# Altium footprint library PCB_LIB.PcbLib: 116 footprints (part 6 of 8)
Each footprint in its own frame and in the unit in brackets; x right, y up, seen from the top. Pads: shape width x height; smd on the part's side, far side on the other; paste and mask are expansions set on the pad; w line width, h text height; cw(c..) or ccw(c..) is an arc to the next point about the centre after c.
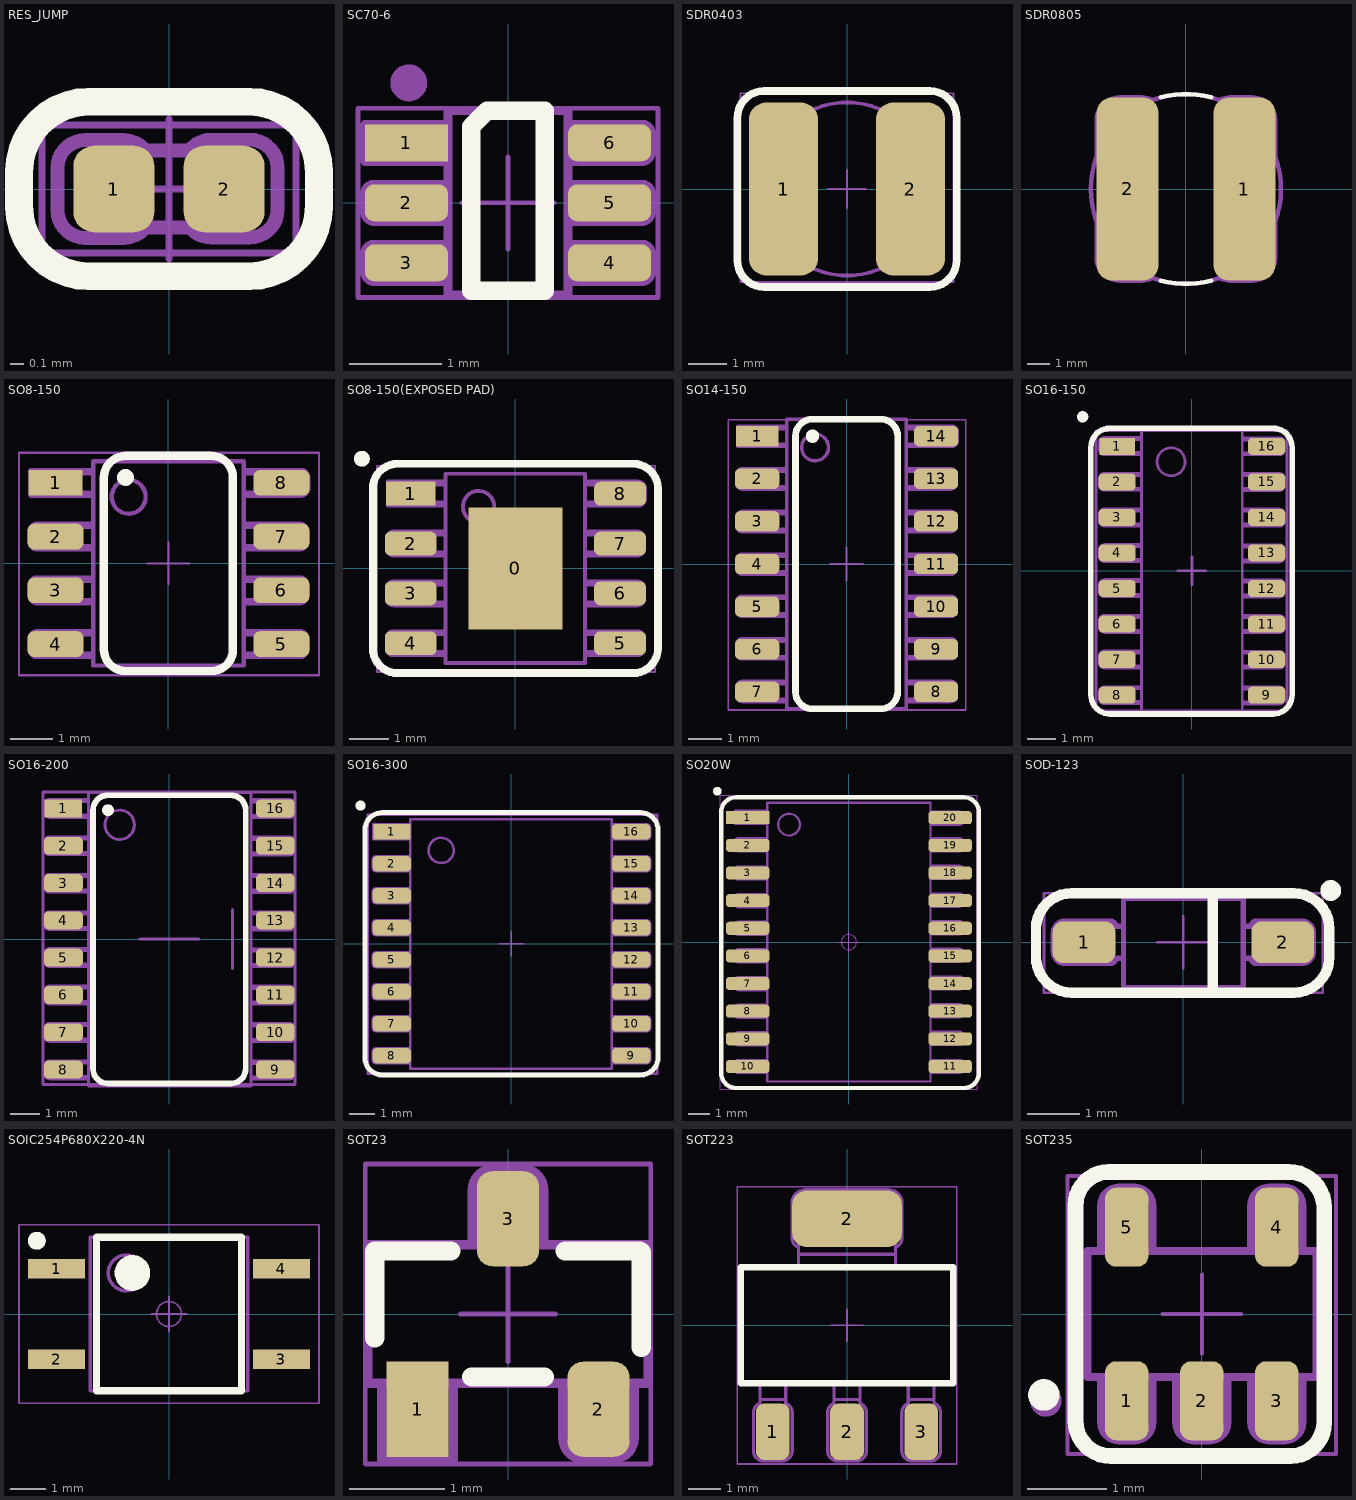
[diagram p5: the footprints below, top view; thin cyan lines are the x and y axes]

## RES_JUMP [mm] "Chip Resistor, EIA 0402, Metric 1005, Body 1.0x0.5mm, IPC Medium Density"
height 0.4
pads (2):
  rrect50% 0.58x0.62 smd: 1(-0.395,0) 2(0.395,0)
Top Overlay:
  lines w0.2: -1.075,-0.125 ccw(c-0.575,-0.125) -0.575,-0.625 0.575,-0.625 ccw(c0.575,-0.125) 1.075,-0.125 1.075,0.125 ccw(c0.575,0.125) 0.575,0.625 -0.575,0.625 ccw(c-0.575,0.125) -1.075,0.125 -1.075,-0.125
Mechanical 14:
  lines w0.1: -0.171,-0.278 cw(c-0.325,-0.15) -0.325,-0.35 -0.6,-0.35 cw(c-0.6,-0.15) -0.8,-0.15 ; -0.171,0.278 ccw(c-0.325,0.15) -0.325,0.35 -0.6,0.35 ccw(c-0.6,0.15) -0.8,0.15 -0.8,-0.15 ; 0.15,-0.275 ccw(c0.304,-0.147) 0.304,-0.347 0.579,-0.347 ccw(c0.579,-0.147) 0.779,-0.147 0.779,0.153 ccw(c0.579,0.153) 0.579,0.353 0.304,0.353 ccw(c0.304,0.153) 0.15,0.281 ; -0.8,-0.15 -0.8,-0.15 ; -0.525,-0.275 0.525,-0.275 0.525,0.275 -0.525,0.275 -0.525,-0.275
  text ".Designator" at -0.8,-0.15 h0.4
  text ".Comment" at -0.508,-0.635 h0.3
Mechanical 15:
  lines w0.05: -0.5,0 0.5,0 ; 0,-0.5 0,0.5 ; -0.91,-0.46 -0.91,0.46 0.91,0.46 0.91,-0.46 -0.91,-0.46
3D body "RESC1005X40N.stp": height 0.4, standoff 0, extent -0.525,-0.275 0.525,0.275

## SC70-6 [mm] "SC70, 6-Leads, Body 2.03x2.10mm, Pitch 0.65mm, IPC Medium Density"
height 1.1
pads (6):
  rect 0.9x0.4 smd: 1(-1.1,0.65)
  rrect50% 0.9x0.4 smd: 2(-1.1,0) 3(-1.1,-0.65) 4(1.1,-0.65) 5(1.1,0) 6(1.1,0.65)
Top Overlay:
  lines w0.2: -0.4,-0.95 -0.4,0.825 -0.225,1 0.4,1 0.4,-0.95 -0.4,-0.95
Mechanical 14:
  circle w0.2: c-1.075,1.3 r0.1
  lines w0.1: -1.55,0.55 -1.55,0.75 ; -1.2,-0.75 -0.65,-0.75 ; -1.2,-0.725 -1.2,-0.575 ; -1.2,-0.55 -0.65,-0.55 ; -1.2,-0.1 -0.65,-0.1 ; -1.2,-0.075 -1.2,0.075 ; -1.2,0.1 -0.65,0.1 ; -1.2,0.55 -0.65,0.55 ; -1.2,0.575 -1.2,0.725 ; -1.2,0.75 -0.65,0.75 ; -0.65,-0.85 -1.45,-0.85 cw(c-1.45,-0.75) -1.55,-0.75 -1.55,-0.55 cw(c-1.45,-0.55) -1.45,-0.45 -0.65,-0.45 ; -0.65,-0.2 -1.45,-0.2 cw(c-1.45,-0.1) -1.55,-0.1 -1.55,0.1 cw(c-1.45,0.1) -1.45,0.2 -0.65,0.2 ; -0.65,0.45 -1.45,0.45 -1.55,0.45 -1.55,0.75 ; -0.65,0.85 -1.45,0.85 -1.55,0.85 -1.55,0.75 ; 0.65,-0.85 1.45,-0.85 ccw(c1.45,-0.75) 1.55,-0.75 1.55,-0.55 ccw(c1.45,-0.55) 1.45,-0.45 0.65,-0.45 ; 0.65,-0.75 1.2,-0.75 ; 0.65,-0.55 1.2,-0.55 ; 0.65,-0.2 1.45,-0.2 ccw(c1.45,-0.1) 1.55,-0.1 1.55,0.1 ccw(c1.45,0.1) 1.45,0.2 0.65,0.2 ; 0.65,-0.1 1.2,-0.1 ; 0.65,0.1 1.2,0.1 ; 0.65,0.45 1.45,0.45 ccw(c1.45,0.55) 1.55,0.55 1.55,0.75 ccw(c1.45,0.75) 1.45,0.85 0.65,0.85 ; 0.65,0.55 1.2,0.55 ; 0.65,0.75 1.2,0.75 ; 1.2,-0.725 1.2,-0.575 ; 1.2,-0.075 1.2,0.075 ; 1.2,0.575 1.2,0.725 ; -0.65,-1 0.65,-1 0.65,1 -0.65,1 -0.65,-1
  text ".Comment" at 0.475,-1 h0.6
  text ".Designator" at 0.025,-1.25 h0.6
Mechanical 15:
  lines w0.05: -0.5,0 0.5,0 ; 0,-0.5 0,0.5 ; -1.625,-1.025 -1.625,1.025 1.625,1.025 1.625,-1.025 -1.625,-1.025
3D body "SC-70-6.STEP": height 1.1, standoff 0, extent -1.06,-1 1.061,1

## SDR0403 [mm] "INDUCTANCE"
pads (2):
  rrect50% 1.8x4.5 smd: 1(-1.65,0) 2(1.65,0)
Top Overlay:
  lines w0.2: -2.85,-1.85 ccw(c-2.15,-1.85) -2.15,-2.55 2.15,-2.55 ccw(c2.15,-1.85) 2.85,-1.85 2.85,1.85 ccw(c2.15,1.85) 2.15,2.55 -2.15,2.55 ccw(c-2.15,1.85) -2.85,1.85 -2.85,-1.85
Mechanical 14:
  circle w0.1: c0,0 r2.25
  lines w0.1: -2.203,-0.4 -1.929,-0.4 ccw(c-1.929,0) -1.929,0.4 -2.203,0.4 ; 2.21,-0.394 1.935,-0.394 cw(c1.935,0.006) 1.935,0.406 2.21,0.406
  text ".Comment" at -2.464,-3.658 h1.5
  text ".Designator" at -4.525,-0.901 h1.9
Mechanical 15:
  lines w0.05: -0.5,0 0.5,0 ; 0,-0.5 0,0.5 ; -2.769,-2.413 -2.769,2.489 2.769,2.489 2.769,-2.413 0,-2.413 -2.769,-2.413
3D body "sdr0403.stp": height 3.2, standoff 0, extent -2.25,-2.25 2.25,2.25

## SDR0805 [mm]
height 10
pads (2):
  rrect50% 2.7x8 smd: 1(2.555,0) 2(-2.55,0)
Top Overlay:
  lines w0.2: -1.1,-4.001 ccw(c0,0) 1.1,-4.001 ; -1.1,4.001 cw(c0,0) 1.1,4.001
Mechanical 14:
  circle w0.2: c0,0 r4.15
  lines w0.2: -3.9,-1.5 -3.9,-3 ccw(c-2.9,-3) -2.9,-4 -1.9,-4 ccw(c-1.9,-3.2) -1.5,-3.893 ; -3.9,1.5 -3.9,3 cw(c-2.9,3) -2.9,4 -1.9,4 cw(c-1.9,3.2) -1.5,3.893 ; 1.5,-3.893 ccw(c1.9,-3.2) 1.9,-4 2.9,-4 ccw(c2.9,-3) 3.9,-3 3.9,-1.5 ; 1.5,3.893 cw(c1.9,3.2) 1.9,4 2.9,4 cw(c2.9,3) 3.9,3 3.9,1.5
  text ".Designator" at -5.105,-0.932 h2.5
3D body "User Library-inductor SDR0805.step": height 5.3, standoff 0, extent -3.925,-3.925 3.875,3.875

## SO8-150 [mil]
pads (8):
  rect 50x24 smd mask+4: 1(-105,75)
  rrect50% 52x24 smd mask+4: 2(-105,25) 3(-105,-25) 4(-105,-75) 5(105,-75) 6(105,-25) 7(105,25) 8(105,75)
Top Overlay:
  circle w7.87: c-40,80 r3.94
  lines w7.87: -60,-80 ccw(c-40,-80) -40,-100 40,-100 ccw(c40,-80) 60,-80 60,80 ccw(c40,80) 40,100 -40,100 ccw(c-40,80) -60,80 -60,-80
Mechanical 14:
  circle w3.94: c-37,62 r15.75
  lines w3.94: -129,-80 ccw(c-122,-80) -122,-87 -73,-87 ccw(c-73,-84) -70,-84 -110,-84 -110,-66 -70,-66 ccw(c-73,-66) -73,-63 -115,-63 -122,-63 ccw(c-122,-70) -129,-70 -129,-80 ; -129,-30 ccw(c-122,-30) -122,-37 -73,-37 ccw(c-73,-34) -70,-34 -110,-34 -110,-16 -70,-16 ccw(c-73,-16) -73,-13 -115,-13 -122,-13 ccw(c-122,-20) -129,-20 -129,-30 ; -129,20 ccw(c-122,20) -122,13 -73,13 ccw(c-73,16) -70,16 -110,16 -110,34 -70,34 ccw(c-73,34) -73,37 -115,37 -122,37 ccw(c-122,30) -129,30 -129,20 ; -128,63 -122,63 -73,63 ccw(c-73,66) -70,66 -110,66 -110,84 -70,84 ccw(c-73,84) -73,87 -115,87 -122,87 -128,87 -128,63 ; -70,-95 -70,95 70,95 70,-95 -70,-95 ; 70,-84 ccw(c73,-84) 73,-87 115,-87 122,-87 ccw(c122,-80) 129,-80 129,-70 ccw(c122,-70) 122,-63 73,-63 ccw(c73,-66) 70,-66 110,-66 110,-84 70,-84 ; 70,-34 ccw(c73,-34) 73,-37 115,-37 122,-37 ccw(c122,-30) 129,-30 129,-20 ccw(c122,-20) 122,-13 73,-13 ccw(c73,-16) 70,-16 110,-16 110,-34 70,-34 ; 70,16 ccw(c73,16) 73,13 115,13 122,13 ccw(c122,20) 129,20 129,30 ccw(c122,30) 122,37 73,37 ccw(c73,34) 70,34 110,34 110,16 70,16 ; 71,66 ccw(c74,66) 74,63 116,63 123,63 ccw(c123,70) 130,70 130,80 ccw(c123,80) 123,87 74,87 ccw(c74,84) 71,84 111,84 111,66 71,66
  text ".Comment" at 74.8,-102.36 h51.18
  text ".Designator" at 0,-100 h51.18
Mechanical 15:
  lines w1.97: -19.68,0 19.68,0 ; 0,-19.68 0,19.68 ; -139,-104 -139,103 -38,103 140,103 140,-104 -139,-104
3D body "SO8-150.STEP": height 67, standoff 0, extent -122.01,-94.99 121.99,95.01

## SO8-150(EXPOSED PAD) [mil]
pads (9):
  rect 94.49x122.05 smd: 0(0,0)
  rect 50x24 smd mask+4: 1(-105,75)
  rrect50% 52x24 smd mask+4: 2(-105,25) 3(-105,-25) 4(-105,-75) 5(105,-75) 6(105,-25) 7(105,25) 8(105,75)
Top Overlay:
  circle w7.87: c-153.94,110 r3.94
  lines w7.87: -143,-80 ccw(c-118,-80) -118,-105 118,-105 ccw(c118,-80) 143,-80 143,80 ccw(c118,80) 118,105 -118,105 ccw(c-118,80) -143,80 -143,-80
Mechanical 14:
  circle w3.94: c-37,62 r15.75
  lines w3.94: -129,-80 ccw(c-122,-80) -122,-87 -73,-87 ccw(c-73,-84) -70,-84 -110,-84 -110,-66 -70,-66 ccw(c-73,-66) -73,-63 -115,-63 -122,-63 ccw(c-122,-70) -129,-70 -129,-80 ; -129,-30 ccw(c-122,-30) -122,-37 -73,-37 ccw(c-73,-34) -70,-34 -110,-34 -110,-16 -70,-16 ccw(c-73,-16) -73,-13 -115,-13 -122,-13 ccw(c-122,-20) -129,-20 -129,-30 ; -129,20 ccw(c-122,20) -122,13 -73,13 ccw(c-73,16) -70,16 -110,16 -110,34 -70,34 ccw(c-73,34) -73,37 -115,37 -122,37 ccw(c-122,30) -129,30 -129,20 ; -128,63 -122,63 -73,63 ccw(c-73,66) -70,66 -110,66 -110,84 -70,84 ccw(c-73,84) -73,87 -115,87 -122,87 -128,87 -128,63 ; -70,-95 -70,95 70,95 70,-95 -70,-95 ; 70,-84 ccw(c73,-84) 73,-87 115,-87 122,-87 ccw(c122,-80) 129,-80 129,-70 ccw(c122,-70) 122,-63 73,-63 ccw(c73,-66) 70,-66 110,-66 110,-84 70,-84 ; 70,-34 ccw(c73,-34) 73,-37 115,-37 122,-37 ccw(c122,-30) 129,-30 129,-20 ccw(c122,-20) 122,-13 73,-13 ccw(c73,-16) 70,-16 110,-16 110,-34 70,-34 ; 70,16 ccw(c73,16) 73,13 115,13 122,13 ccw(c122,20) 129,20 129,30 ccw(c122,30) 122,37 73,37 ccw(c73,34) 70,34 110,34 110,16 70,16 ; 71,66 ccw(c74,66) 74,63 116,63 123,63 ccw(c123,70) 130,70 130,80 ccw(c123,80) 123,87 74,87 ccw(c74,84) 71,84 111,84 111,66 71,66
  text ".Comment" at -98,-158 h59.06
  text ".Designator" at -259.76,-62.99 h78.74
Mechanical 15:
  lines w1.97: -19.68,0 19.68,0 ; 0,-19.68 0,19.68 ; -139,-104 -139,103 -38,103 140,103 140,-104 -139,-104
3D body "SO8-150.STEP": height 67, standoff 0, extent -122.01,-94.99 121.99,95.01

## SO14-150 [mil]
pads (14):
  rect 50x24 smd mask+4: 1(-105,150)
  rrect50% 52x24 smd mask+4: 2(-105,100) 3(-105,50) 4(-105,0) 5(-105,-50) 6(-105,-100) 7(-105,-150) 8(105,-150) 9(105,-100) 10(105,-50) 11(105,0) 12(105,50) 13(105,100) 14(105,150)
Top Overlay:
  circle w7.87: c-40,150 r3.94
  lines w7.87: 60,-140 60,-150 ; 60,110 60,150 ; 60,-150 cw(c40,-150) 40,-170 -40,-170 cw(c-40,-150) -60,-150 -60,150 cw(c-40,150) -40,170 40,170 cw(c40,150) 60,150 ; 60,-150 60,150
Mechanical 14:
  drawing of 159 lines, arcs and shapes, not listed
  text ".Designator" at 3.94,-161.42 h78.74
  text ".Comment" at 62.99,-98.43 h59.06
Mechanical 15:
  lines w1.97: -19.68,0 19.68,0 ; 0,-19.68 0,19.68 ; -138.78,-171.26 -138.78,169.29 -116.14,169.29 139.76,169.29 139.76,-171.26 -138.78,-171.26
3D body "SO14-150.STEP": height 67, standoff 0, extent -122,-170 122,170

## SO16-150 [mil]
pads (16):
  rect 50x24 smd mask+4: 1(-105,175)
  rrect50% 52x24 smd mask+4: 2(-105,125) 3(-105,75) 4(-105,25) 5(-105,-25) 6(-105,-75) 7(-105,-125) 8(-105,-175) 9(105,-175) 10(105,-125) 11(105,-75) 12(105,-25) 13(105,25) 14(105,75) 15(105,125) 16(105,175)
Top Overlay:
  circle w7.87: c-153.54,216.54 r3.94
  lines w7.87: -142.01,-174.44 ccw(c-115.01,-174.44) -115.01,-201.44 114.02,-201.44 ccw(c114.02,-174.44) 141.02,-174.44 141.02,173.46 ccw(c114.02,173.46) 114.02,200.46 -115.01,200.46 ccw(c-115.01,173.46) -142.01,173.46 -142.01,-174.44
Mechanical 14:
  drawing of 181 lines, arcs and shapes, not listed
  text ".Comment" at -192.91,104.33 h59.06
  text ".Designator" at -34.45,163.39 h78.74
Mechanical 15:
  lines w3.94: -19.68,0 19.68,0 ; 0,-19.68 0,19.68 ; -134.84,-196.85 -134.84,196.85 26.57,196.85 133.86,196.85 133.86,-196.85 -134.84,-196.85
3D body "SO16-150.STEP": height 67, standoff 0, extent -122,-195 122,195

## SO16-200 [mil]
pads (16):
  rect 50x24 smd mask+4: 1(-142,175)
  rrect50% 52x24 smd mask+4: 2(-142,125) 3(-142,75) 4(-142,25) 5(-142,-25) 6(-142,-75) 7(-142,-125) 8(-142,-175) 9(142,-175) 10(142,-125) 11(142,-75) 12(142,-25) 13(142,25) 14(142,75) 15(142,125) 16(142,175)
Top Overlay:
  circle w7.87: c-82.32,172.64 r3.94
  lines w7.87: -102.32,-173.62 ccw(c-82.32,-173.62) -82.32,-193.62 79.72,-193.62 ; -102.32,-173.23 -102.32,172.64 cw(c-82.32,172.64) -82.32,192.64 81.69,192.64 ; 82.32,-193.62 ccw(c82.32,-173.62) 102.32,-173.62 102.32,-163.62 ; 82.32,192.64 cw(c82.32,172.64) 102.32,172.64 ; 102.32,-165.35 102.32,172.64 ; 102.32,132.64 102.32,172.64
Mechanical 14:
  drawing of 181 lines, arcs and shapes, not listed
  text ".Designator" at -2.95,-166.34 h78.74
  text ".Comment" at 80.71,-198.82 h59.06
Mechanical 15:
  lines w3.94: -39.37,0 39.37,0 ; 84.65,-39.37 84.65,39.37 ; -169.29,-194.88 168.31,-194.88 168.31,196.85 -101.38,196.85 -169.29,196.85 -169.29,-194.88
3D body "SO16-200.STEP": height 67, standoff 0, extent -161,-195 161,195

## SO16-300 [mil]
pads (16):
  rect 58x24 smd mask+4: 1(-187,175)
  rrect50% 60x24 smd mask+4: 2(-187,125) 3(-187,75) 4(-187,25) 5(-187,-25) 6(-187,-75) 7(-187,-125) 8(-187,-175) 9(187,-175) 10(187,-125) 11(187,-75) 12(187,-25) 13(187,25) 14(187,75) 15(187,125) 16(187,175)
Top Overlay:
  circle w7.87: c-235.94,216 r3.94
  lines w7.87: -229,-178 ccw(c-202,-178) -202,-205 202,-205 ccw(c202,-178) 229,-178 229,178 ccw(c202,178) 202,205 -202,205 ccw(c-202,178) -229,178 -229,-177
Mechanical 14:
  drawing of 181 lines, arcs and shapes, not listed
  text ".Designator" at -262.76,-60.99 h125.98
  text ".Comment" at -97,-263 h59.06
Mechanical 15:
  lines w1.97: -19.68,0 19.68,0 ; 0,-19.68 0,19.68
  lines w3.94: -225,-203 -225,182 -225,202 228,202 228,-203 -225,-203
3D body "SO16-300.STEP": height 67, standoff 0, extent -209.5,-195 209.5,195

## SO20W [mm] "SOIC, 1.27mm pitch; 20 pin, 7.50mm W X 12.80mm L X 2.65mm H body, IPC Medium Density"
height 2.65
pads (20):
  rect 2x0.6 smd: 1(-4.65,5.715)
  rrect50% 2x0.6 smd: 2(-4.65,4.445) 3(-4.65,3.175) 4(-4.65,1.905) 5(-4.65,0.635) 6(-4.65,-0.635) 7(-4.65,-1.905) 8(-4.65,-3.175) 9(-4.65,-4.445) 10(-4.65,-5.715) 11(4.65,-5.715) 12(4.65,-4.445) 13(4.65,-3.175) 14(4.65,-1.905) 15(4.65,-0.635) 16(4.65,0.635) 17(4.65,1.905) 18(4.65,3.175) 19(4.65,4.445) 20(4.65,5.715)
Top Overlay:
  circle w0.2: c-6.044,6.934 r0.1
  lines w0.2: -5.867,-6.02 ccw(c-5.182,-6.02) -5.182,-6.706 5.283,-6.706 ccw(c5.283,-6.02) 5.969,-6.02 5.969,5.969 ccw(c5.283,5.969) 5.283,6.655 -5.182,6.655 ccw(c-5.182,5.969) -5.867,5.969 -5.867,-6.02
Mechanical 14:
  drawing of 225 lines, arcs and shapes, not listed
Mechanical 15:
  circle w0.05: c0,0 r0.35
  lines w0.05: -0.5,0 0.5,0 ; 0,-0.5 0,0.5 ; -5.9,-6.75 -5.9,6.75 5.9,6.75 5.9,-6.75 -5.9,-6.75
3D body "SOIC127P1032X265-20N.stp": height 1.68, standoff 0, extent -5.18,-6.5 5.18,6.5

## SOD-123 [mm] "SOD-123; 2 Leads; Body 2.7 x 1.6 mm, (LxW)"
height 1.35
pads (2):
  rrect50% 1.2x0.8 smd: 1(-1.9,0) 2(1.9,0)
Top Overlay:
  circle w0.2: c2.819,0.991 r0.1
  lines w0.2: 0.559,-0.965 0.559,0.94 ; -2.819,-0.279 ccw(c-2.134,-0.279) -2.134,-0.965 -1.575,-0.965 2.108,-0.965 ccw(c2.108,-0.279) 2.794,-0.279 2.794,0.254 ccw(c2.108,0.254) 2.108,0.94 -2.134,0.94 ccw(c-2.134,0.254) -2.819,0.254 -2.819,-0.279
Mechanical 14:
  lines w0.1: -1.295,-0.305 cw(c-1.397,-0.305) -1.397,-0.406 -2.261,-0.406 cw(c-2.261,-0.178) -2.489,-0.178 -2.489,0.178 cw(c-2.261,0.178) -2.261,0.406 -1.397,0.406 cw(c-1.397,0.305) -1.295,0.305 ; -1.143,-0.305 -1.88,-0.305 cw(c-1.88,-0.178) -2.007,-0.178 -2.007,0.178 cw(c-1.88,0.178) -1.88,0.305 -1.143,0.305 ; 0.584,-0.864 0.584,0.838 ; 1.143,-0.305 1.88,-0.305 ccw(c1.88,-0.178) 2.007,-0.178 2.007,0.178 ccw(c1.88,0.178) 1.88,0.305 1.143,0.305 ; 1.295,-0.305 ccw(c1.397,-0.305) 1.397,-0.406 2.261,-0.406 ccw(c2.261,-0.178) 2.489,-0.178 2.489,0.178 ccw(c2.261,0.178) 2.261,0.406 1.397,0.406 ccw(c1.397,0.305) 1.295,0.305 ; -1.143,-0.864 1.143,-0.864 1.143,0.838 -1.143,0.838 -1.143,-0.864
  text ".Designator" at -2.134,-0.483 h0.9
  text ".Comment" at -2.591,-2.362 h1.5
Mechanical 15:
  lines w0.05: -0.5,0 0.5,0 ; 0,-0.5 0,0.5 ; -2.667,-0.965 -2.667,0.076 -2.667,0.94 2.667,0.94 2.667,-0.965 -2.667,-0.965
3D body "SOD-123_DiodesInc.step": height 1.43, standoff -0.02, extent -1.92,-0.862 1.93,0.838

## SOIC254P680X220-4N [mm] "SOIC,2.54mm,pitch;4 pin,4.40mm W X 4.30mm L X 2.20mm H body, IPC Medium Density"
height 2.2
pads (4):
  rect 1.6x0.55 smd: 1(-3.15,1.27) 2(-3.15,-1.27) 3(3.15,-1.27) 4(3.15,1.27)
Top Overlay:
  circle w0.25: c-3.7,2.05 r0.125
  circle w0.5: c-1.025,1.15 r0.25
  lines w0.2: -2.025,-2.15 -2.025,2.15 2.025,2.15 2.025,-2.15 -2.025,-2.15
Mechanical 14:
  circle w0.1: c-1.2,1.15 r0.5
  lines w0.1: -2.2,-2.15 -2.2,2.15 2.2,2.15 2.2,-2.15 -2.2,-2.15
Mechanical 15:
  circle w0.05: c0,0 r0.35
  lines w0.05: -0.5,0 0.5,0 ; 0,-0.5 0,0.5 ; -4.2,-2.5 -4.2,2.5 4.2,2.5 4.2,-2.5 -4.2,-2.5
3D body "SOIC254P680X220-4N.stp": height 2.2, standoff 0, extent -3.6,-2.15 3.6,2.15

## SOT23 [mm] "SOT-23; 3 Leads; Body 3.0 x 2.6 mm Pitch 0.95mm"
pads (3):
  rect 0.65x1 smd: 1(-0.95,-1)
  rrect50% 0.65x1 smd: 2(0.95,-1) 3(0,1)
Top Overlay:
  lines w0.2: -1.399,-0.25 -1.399,0.662 -0.6,0.662 ; -0.381,-0.662 0.381,-0.662 ; 0.6,0.662 1.388,0.662 1.399,0.651 1.399,-0.35
Mechanical 14:
  lines w0.1: -1.325,-0.725 -1.325,-1.525 -0.575,-1.525 -0.575,-0.725 ; -1.125,-0.725 -1.125,-1.275 -0.775,-1.275 -0.775,-0.725 ; -0.375,0.725 -0.375,1.3 cw(c-0.15,1.3) -0.15,1.525 0.15,1.525 cw(c0.15,1.3) 0.375,1.3 0.375,0.725 ; -0.175,0.725 -0.175,1.275 0.175,1.275 0.175,0.725 ; 0.575,-0.725 0.575,-1.3 ccw(c0.8,-1.3) 0.8,-1.525 1.1,-1.525 ccw(c1.1,-1.3) 1.325,-1.3 1.325,-0.725 ; 0.775,-0.725 0.775,-1.275 1.125,-1.275 1.125,-0.725 ; -1.475,-0.725 1.475,-0.725 1.475,0.725 -1.475,0.725 -1.475,-0.725
  text ".Designator" at -1.65,-0.375 h0.8
Mechanical 15:
  lines w0.05: -0.5,0 0.5,0 ; 0,-0.5 0,0.5 ; -1.5,-1.575 1.5,-1.575 1.5,1.575 -1.5,1.575 -1.5,-1.575
3D body "SOT-23 3.STEP": height 1, standoff -0.02, extent -1.46,-1.231 1.46,1.245

## SOT223 [mm] "SOT-223/SC-73; 4 Leads; Body 6.7 x 7.3 mm, inc. leads (LxW max)"
height 1.8
pads (4):
  rrect50% 1.05x1.75 smd: 1(-2.3,-3.3) 2(0,-3.3) 3(2.3,-3.3)
  rrect50% 3.4x1.75 smd: 2(0,3.3)
Top Overlay:
  lines w0.2: -3.3,-1.8 -3.3,1.8 3.3,1.8 3.3,-1.8 -3.3,-1.8
Mechanical 14:
  lines w0.1: -2.703,-2.418 ccw(c-2.6,-2.7) -2.9,-2.7 -2.9,-3.9 ccw(c-2.6,-3.9) -2.6,-4.2 -2,-4.2 ccw(c-2,-3.9) -1.7,-3.9 -1.7,-3.3 -1.7,-2.7 ccw(c-2,-2.7) -1.897,-2.418 ; -2.7,-2.7 -1.9,-2.7 ; -2.7,-2.3 -1.9,-2.3 ; -2.7,-1.8 -2.7,-3.8 -1.9,-3.8 -1.9,-1.8 ; -1.503,2.418 cw(c-1.4,2.7) -1.7,2.7 -1.7,3.8 cw(c-1.3,3.8) -1.3,4.2 1.3,4.2 cw(c1.3,3.8) 1.7,3.8 1.7,2.7 cw(c1.4,2.7) 1.503,2.418 ; -1.5,1.8 -1.5,4 1.5,4 1.5,1.8 ; -1.5,2.2 1.5,2.2 ; -1.5,3 1.5,3 ; -0.403,-2.418 ccw(c-0.3,-2.7) -0.6,-2.7 -0.6,-3.9 ccw(c-0.3,-3.9) -0.3,-4.2 0.3,-4.2 ccw(c0.3,-3.9) 0.6,-3.9 0.6,-3.3 0.6,-2.7 ccw(c0.3,-2.7) 0.403,-2.418 ; -0.4,-2.7 0.4,-2.7 ; -0.4,-2.3 0.4,-2.3 ; -0.4,-1.8 -0.4,-3.8 0.4,-3.8 0.4,-1.8 ; 1.897,-2.418 ccw(c2,-2.7) 1.7,-2.7 1.7,-3.9 ccw(c2,-3.9) 2,-4.2 2.6,-4.2 ccw(c2.6,-3.9) 2.9,-3.9 2.9,-3.3 2.9,-2.7 ccw(c2.6,-2.7) 2.703,-2.418 ; 1.9,-2.7 2.7,-2.7 ; 1.9,-2.3 2.7,-2.3 ; 1.9,-1.8 1.9,-3.8 2.7,-3.8 2.7,-1.8 ; -3.3,-1.8 3.3,-1.8 3.3,1.8 -3.3,1.8 -3.3,-1.8
  text ".Designator" at -3.7,-0.825 h1.7
Mechanical 15:
  lines w0.05: -0.5,0 0.5,0 ; 0,-0.5 0,0.5 ; -3.4,-4.3 -3.4,-1 -3.4,4.3 3.4,4.3 3.4,-4.3 -3.4,-4.3
3D body "SOT223.STEP": height 1.64, standoff -0.01, extent -3.25,-3.5 3.25,3.5

## SOT235 [mm] "SOT23, 5-Leads, Body 2.9x1.3mm, Pitch 0.95mm, Lead Span 2.5mm"
height 1.45
pads (5):
  rrect50% 0.55x1 smd: 1(-0.95,-1.1) 2(0,-1.1) 3(0.95,-1.1) 4(0.95,1.1) 5(-0.95,1.1)
Top Overlay:
  circle w0.2: c-2,-1.025 r0.1
  lines w0.2: -1.6,-1.35 ccw(c-1.15,-1.35) -1.15,-1.8 1.125,-1.8 ccw(c1.125,-1.375) 1.55,-1.375 1.55,1.35 ccw(c1.1,1.35) 1.1,1.8 -1.175,1.8 ccw(c-1.175,1.375) -1.6,1.375 -1.6,-0.775 -1.6,-1.35
Mechanical 14:
  circle w0.2: c-1.975,-1.1 r0.1
  lines w0.1: -1.275,-0.8 -1.275,-1.375 ccw(c-1.05,-1.375) -1.05,-1.6 -0.85,-1.6 ccw(c-0.85,-1.375) -0.625,-1.375 -0.625,-0.8 ; -1.275,0.8 -1.275,1.375 cw(c-1.05,1.375) -1.05,1.6 -0.85,1.6 cw(c-0.85,1.375) -0.625,1.375 -0.625,0.8 ; -1.125,-0.8 -1.125,-1.35 -0.775,-1.35 -0.775,-0.8 ; -1.125,0.8 -1.125,1.35 -0.775,1.35 -0.775,0.8 ; -0.325,-0.8 -0.325,-1.375 ccw(c-0.1,-1.375) -0.1,-1.6 0.1,-1.6 ccw(c0.1,-1.375) 0.325,-1.375 0.325,-0.8 ; -0.175,-0.8 -0.175,-1.35 0.175,-1.35 0.175,-0.8 ; 0.625,-0.8 0.625,-1.375 ccw(c0.85,-1.375) 0.85,-1.6 1.05,-1.6 ccw(c1.05,-1.375) 1.275,-1.375 1.275,-0.8 ; 0.625,0.8 0.625,1.375 cw(c0.85,1.375) 0.85,1.6 1.05,1.6 cw(c1.05,1.375) 1.275,1.375 1.275,0.8 ; 0.775,-0.8 0.775,-1.35 1.125,-1.35 1.125,-0.8 ; 0.775,0.8 0.775,1.35 1.125,1.35 1.125,0.8 ; -1.45,-0.8 1.45,-0.8 1.45,0.8 -1.45,0.8 -1.45,-0.8
  text ".Designator" at -4.125,-0.825 h1.6
  text ".Comment" at -4.2,-2.975 h1.5
Mechanical 15:
  lines w0.05: -0.5,0 0.5,0 ; 0,-0.5 0,0.5 ; -1.7,-1.775 1.7,-1.775 1.7,1.75 -1.7,1.75 -1.7,-1.775
3D body "SOT-23-5.STEP": height 1.09, standoff -0.01, extent -1.45,-1.422 1.45,1.378